# Altium footprint library EwgMicrochips.PcbLib: 61 footprints (part 1 of 4)
Each footprint in its own frame and in the unit in brackets; x right, y up, seen from the top. Pads: shape width x height; smd on the part's side, far side on the other; paste and mask are expansions set on the pad; w line width, h text height; cw(c..) or ccw(c..) is an arc to the next point about the centre after c.
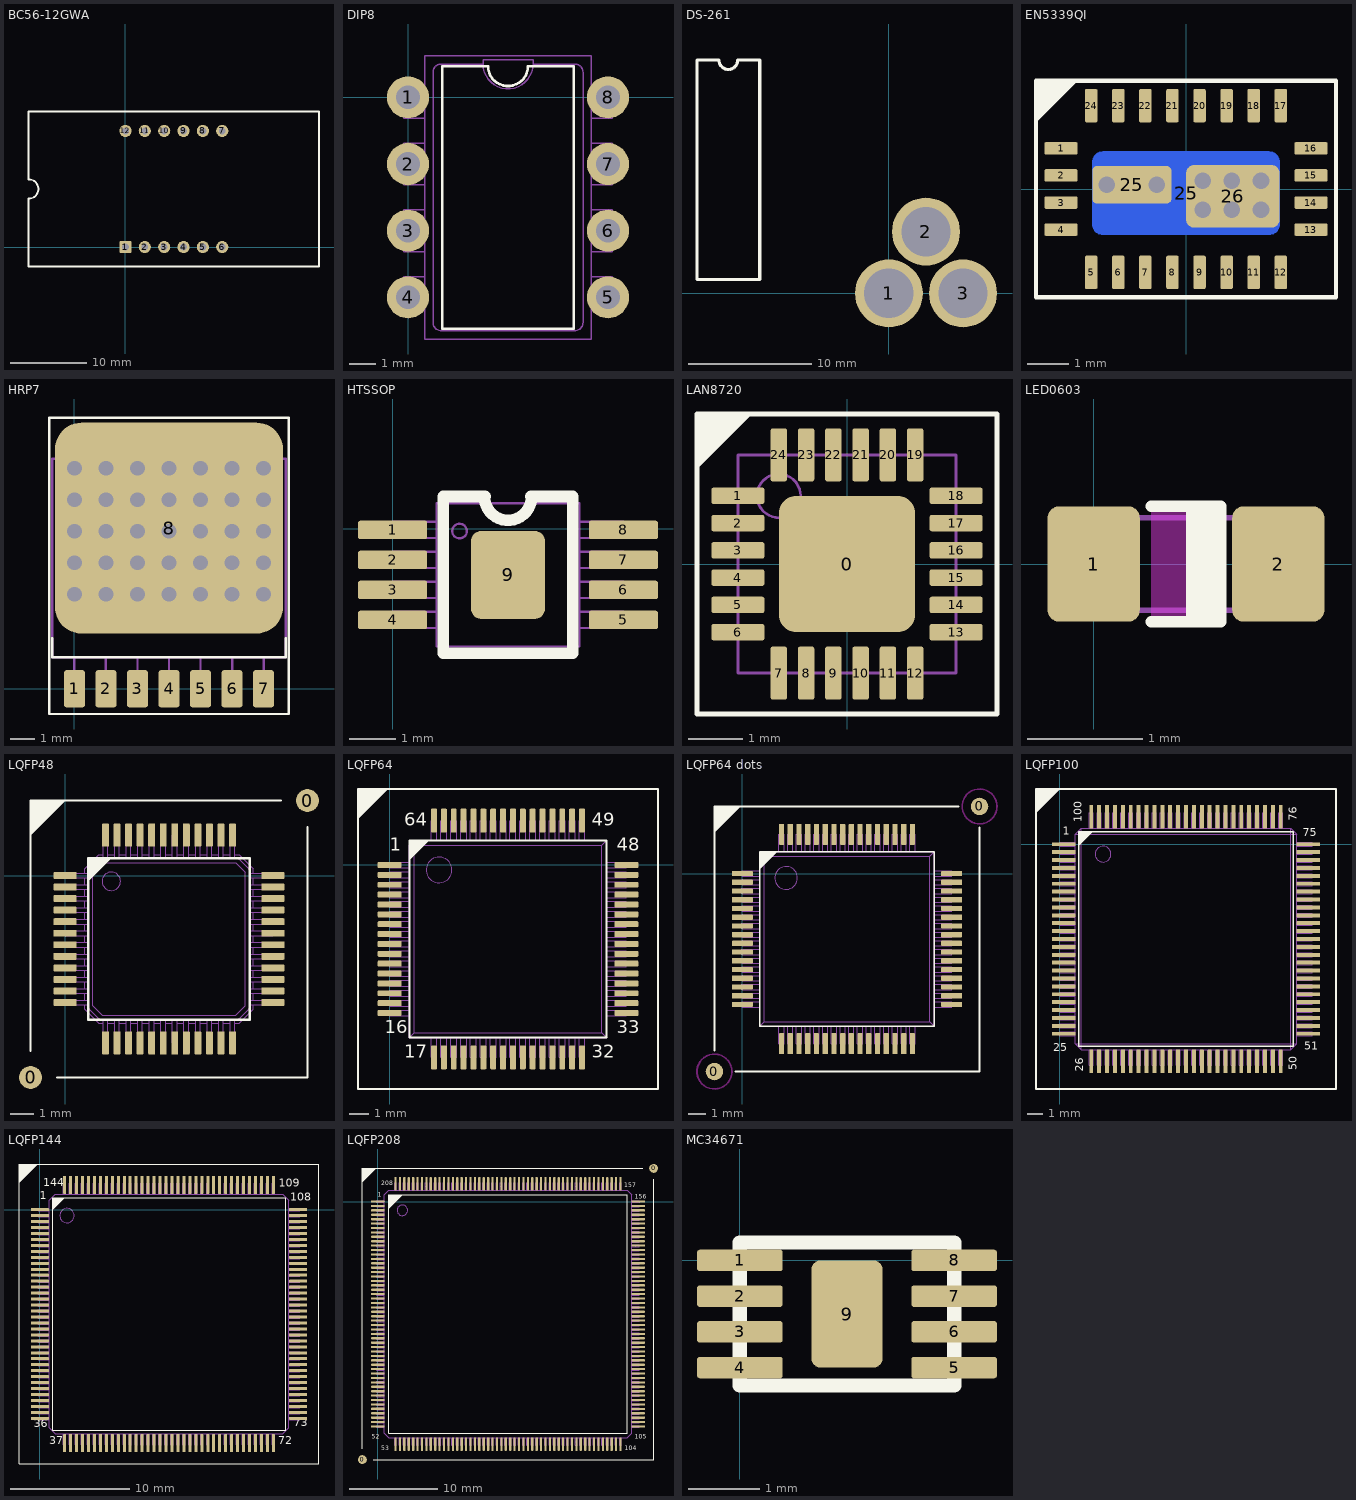
[diagram p0: the footprints below, top view; thin cyan lines are the x and y axes]

## BC56-12GWA [mm]
pads (12):
  rrect25% 1.6x1.6 hole 0.9: 1(0,0)
  round 1.6 hole 0.9: 2(2.54,0) 3(5.08,0) 4(7.62,0) 5(10.16,0) 6(12.7,0) 7(12.7,15.24) 8(10.16,15.24) 9(7.62,15.24) 10(5.08,15.24) 11(2.54,15.24) 12(0,15.24)
Top Overlay:
  lines w0.254: -12.7,-2.54 -12.7,6.35 ccw(c-12.7,7.62) -12.7,8.89 -12.7,17.78 25.4,17.78 25.4,-2.54 -12.7,-2.54

## DIP8 [mm]
pads (8):
  round 1.6 hole 0.9: 1(0,0) 2(0,-2.54) 3(0,-5.08) 4(0,-7.62) 5(7.62,-7.62) 6(7.62,-5.08) 7(7.62,-2.54) 8(7.62,0)
Top Overlay:
  lines w0.1: 1.31,-8.81 1.31,1.19 3.048,1.19 ccw(c3.81,1.19) 4.572,1.19 6.31,1.19 6.31,-8.81 1.31,-8.81
Mechanical 1:
  lines w0.05: 0.635,-7.938 -0.159,-7.938 -0.159,-7.461 -0.159,-6.826 0.635,-6.826 ; 0.635,-5.874 -0.159,-5.874 -0.159,-4.286 0.635,-4.286 ; 0.635,-3.334 -0.159,-3.334 -0.159,-1.746 0.635,-1.746 ; 0.635,-0.794 -0.159,-0.794 -0.159,-0.318 -0.159,0.318 0.635,0.318 ; 6.985,-7.938 7.779,-7.938 7.779,-7.461 7.779,-6.826 6.985,-6.826 ; 6.985,-5.874 7.779,-5.874 7.779,-4.286 6.985,-4.286 ; 6.985,-3.334 7.779,-3.334 7.779,-1.746 6.985,-1.746 ; 6.985,-0.794 7.779,-0.794 7.779,-0.318 7.779,0.318 6.985,0.318 ; 2.857,1.27 ccw(c3.81,1.27) 4.763,1.27 ; 2.857,1.27 1.27,1.27 ccw(c1.27,0.953) 0.953,0.953 0.953,-8.572 ccw(c1.27,-8.572) 1.27,-8.89 6.35,-8.89 ccw(c6.35,-8.572) 6.667,-8.572 6.667,0.953 ccw(c6.35,0.953) 6.35,1.27 4.763,1.27 ; 2.857,1.27 2.857,1.429 4.763,1.429 4.763,1.27 ; 0.635,-9.207 0.635,1.587 6.985,1.587 6.985,-9.207 0.635,-9.207
3D body: height 5.1, standoff -3.18, extent -0.28,-8.925 7.98,1.075

## DS-261 [mm]
pads (3):
  round 5.5 hole 4: 1(0,0) 2(3,5) 3(6,0)
Top Overlay:
  lines w0.254: -15.54,1.11 -15.54,18.89 -13.762,18.89 ccw(c-13,18.89) -12.238,18.89 -10.46,18.89 -10.46,1.11 -15.54,1.11

## EN5339QI [mm]
pads (27):
  rrect25% 0.8x0.3 smd: 1(-3,0.975) 2(-3,0.325) 3(-3,-0.325) 4(-3,-0.975) 13(3,-0.975) 14(3,-0.325) 15(3,0.325) 16(3,0.975)
  rrect25% 0.3x0.8 smd: 5(-2.275,-2) 6(-1.625,-2) 7(-0.975,-2) 8(-0.325,-2) 9(0.325,-2) 10(0.975,-2) 11(1.625,-2) 12(2.275,-2) 17(2.275,2) 18(1.625,2) 19(0.975,2) 20(0.325,2) 21(-0.325,2) 22(-0.975,2) 23(-1.625,2) 24(-2.275,2)
  rrect25% 1.9x0.9 smd: 25(-1.3,0.1)
  rrect25% 4.5x2 smd far side: 25(0,-0.1)
  rrect25% 2.25x1.5 smd: 26(1.125,-0.175)
via 0.4,0.2 diameter 0.6 hole 0.4
via 1.8,0.2 diameter 0.6 hole 0.4
via 0.4,-0.5 diameter 0.6 hole 0.4
via 1.8,-0.5 diameter 0.6 hole 0.4
via 1.1,-0.5 diameter 0.6 hole 0.4
via 1.1,0.2 diameter 0.6 hole 0.4
via -0.7,0.1 diameter 0.6 hole 0.4
via -1.9,0.1 diameter 0.6 hole 0.4
Top Overlay:
  region: -3.6,1.6 -2.6,2.6 -3.6,2.6
  lines w0.1: -3.6,-2.6 3.6,-2.6 3.6,2.6 -3.6,2.6 -3.6,-2.6
3D body: height 1.6, standoff 0, extent -3,-2 3,2

## HRP7 [mm]
pads (8):
  rrect25% 0.85x1.5 smd: 1(0,0) 2(1.27,0) 3(2.54,0) 4(3.81,0) 5(5.08,0) 6(6.35,0) 7(7.62,0)
  rrect25% 9.2x8.5 all layers, no hole: 8(3.81,6.477)
via 7.62,8.89 diameter 0.8 hole 0.6
via 7.62,7.62 diameter 0.8 hole 0.6
via 7.62,6.35 diameter 0.8 hole 0.6
via 7.62,5.08 diameter 0.8 hole 0.6
via 7.62,3.81 diameter 0.8 hole 0.6
via 6.35,3.81 diameter 0.8 hole 0.6
via 6.35,5.08 diameter 0.8 hole 0.6
via 6.35,6.35 diameter 0.8 hole 0.6
via 6.35,7.62 diameter 0.8 hole 0.6
via 6.35,8.89 diameter 0.8 hole 0.6
via 5.08,8.89 diameter 0.8 hole 0.6
via 5.08,7.62 diameter 0.8 hole 0.6
via 5.08,6.35 diameter 0.8 hole 0.6
via 5.08,5.08 diameter 0.8 hole 0.6
via 5.08,3.81 diameter 0.8 hole 0.6
via 3.81,3.81 diameter 0.8 hole 0.6
via 3.81,5.08 diameter 0.8 hole 0.6
via 3.81,6.35 diameter 0.8 hole 0.6
via 3.81,7.62 diameter 0.8 hole 0.6
via 3.81,8.89 diameter 0.8 hole 0.6
via 2.54,8.89 diameter 0.8 hole 0.6
via 2.54,3.81 diameter 0.8 hole 0.6
via 2.54,5.08 diameter 0.8 hole 0.6
via 2.54,6.35 diameter 0.8 hole 0.6
via 2.54,7.62 diameter 0.8 hole 0.6
via 1.27,7.62 diameter 0.8 hole 0.6
via 1.27,8.89 diameter 0.8 hole 0.6
via 1.27,6.35 diameter 0.8 hole 0.6
via 1.27,5.08 diameter 0.8 hole 0.6
via 1.27,3.81 diameter 0.8 hole 0.6
via 0,3.81 diameter 0.8 hole 0.6
via 0,5.08 diameter 0.8 hole 0.6
via 0,6.35 diameter 0.8 hole 0.6
via 0,7.62 diameter 0.8 hole 0.6
via 0,8.89 diameter 0.8 hole 0.6
Top Overlay:
  lines w0.1: -0.889,2.032 -0.889,1.27 8.509,1.27 8.509,2.032 ; -1.016,-1.016 -1.016,10.922 8.636,10.922 8.636,-1.016 -1.016,-1.016
Mechanical 1:
  lines w0.1: -0.635,9.271 -0.635,9.525 0.127,10.287 3.81,10.287 7.493,10.287 8.255,9.525 8.255,9.271 ; 0,-0.254 0,1.27 ; 1.27,-0.254 1.27,1.27 ; 2.54,-0.254 2.54,1.27 ; 3.81,-0.254 3.81,1.27 ; 5.08,-0.254 5.08,1.27 ; 6.35,-0.254 6.35,1.27 ; 7.62,-0.254 7.62,1.27 ; 3.81,1.27 -0.889,1.27 -0.889,9.271 8.509,9.271 8.509,1.27 3.81,1.27
3D body: height 1.91, standoff -0.01, extent -0.887,-0.253 8.508,10.287

## HTSSOP [mm]
pads (9):
  rrect25% 1.5x0.4 smd: 1(0,-0.025) 2(0,-0.675) 3(0,-1.325) 4(0,-1.975) 5(5,-1.975) 6(5,-1.325) 7(5,-0.675) 8(5,-0.025)
  rrect25% 1.6x1.9 smd: 9(2.5,-1)
Top Overlay:
  lines w0.254: 1.992,0.69 ccw(c2.5,0.69) 3.008,0.69 ; 2,0.7 1.1,0.7 1.1,-2.7 3.9,-2.7 3.9,0.7 3,0.7
Mechanical 1:
  circle w0.05: c1.45,-0.05 r0.158
  lines w0.05: 0.95,-2.15 0,-2.15 0,-1.8 0.95,-1.8 ; 0.95,-1.5 0,-1.5 0,-1.15 0.95,-1.15 ; 0.95,-0.85 0,-0.85 0,-0.5 0.95,-0.5 ; 0.95,-0.2 0,-0.2 0,0.15 0.95,0.15 ; 4.05,-2.15 5,-2.15 5,-1.8 4.05,-1.8 ; 4.05,-1.5 5,-1.5 5,-1.15 4.05,-1.15 ; 4.05,-0.85 5,-0.85 5,-0.5 4.05,-0.5 ; 4.05,-0.2 5,-0.2 5,0.15 4.05,0.15 ; 0.95,-2.55 4.05,-2.55 4.05,0.55 0.95,0.55 0.95,-2.55

## LAN8720 [mm]
pads (25):
  rrect25% 2.5x2.5 smd: 0(0,0)
  rrect25% 0.97x0.3 smd: 1(-2,1.25) 2(-2,0.75) 3(-2,0.25) 4(-2,-0.25) 5(-2,-0.75) 6(-2,-1.25) 13(2,-1.25) 14(2,-0.75) 15(2,-0.25) 16(2,0.25) 17(2,0.75) 18(2,1.25)
  rrect25% 0.3x0.97 smd: 7(-1.25,-2) 8(-0.75,-2) 9(-0.25,-2) 10(0.25,-2) 11(0.75,-2) 12(1.25,-2) 19(1.25,2) 20(0.75,2) 21(0.25,2) 22(-0.25,2) 23(-0.75,2) 24(-1.25,2)
Top Overlay:
  region: -2.75,2.75 -1.75,2.75 -2.75,1.75
  lines w0.1: -2.75,-2.75 -2.75,2.75 2.75,2.75 2.75,-2.75 -2.75,-2.75
Mechanical 1:
  circle w0.05: c-1.25,1.25 r0.4
  lines w0.05: -2,-2 -2,2 2,2 2,-2 -2,-2
3D body: height 1, standoff 0, extent -2.01,-2.01 2.01,2.01

## LED0603 [mm]
pads (2):
  rrect25% 0.8x1 smd: 1(0,0) 2(1.6,0)
Top Layer keep-out:
  region: 0.5,0.5 0.5,-0.5 1.1,-0.5 1.1,0.5
Top Overlay:
  region: 0.8,0.5 0.8,-0.5 1.1,-0.5 1.1,0.5
  lines w0.1: 0.5,-0.5 1.1,-0.5 1.1,0.5 0.5,0.5
Mechanical 1:
  lines w0.05: 0.3,-0.4 0.3,0.4 ; 1.3,-0.4 1.3,0.4 ; 0,-0.4 1.6,-0.4 1.6,0.4 0,0.4 0,-0.4

## LQFP48 [mm]
pads (50):
  round 1 smd paste+0.5: 0(-1.5,-8.75) 0(10.5,3.25)
  rrect25% 1x0.3 smd: 1(0,0) 2(0,-0.5) 3(0,-1) 4(0,-1.5) 5(0,-2) 6(0,-2.5) 7(0,-3) 8(0,-3.5) 9(0,-4) 10(0,-4.5) 11(0,-5) 12(0,-5.5) 25(9,-5.5) 26(9,-5) 27(9,-4.5) 28(9,-4) 29(9,-3.5) 30(9,-3) 31(9,-2.5) 32(9,-2) 33(9,-1.5) 34(9,-1) 35(9,-0.5) 36(9,0)
  rrect25% 0.3x1 smd: 13(1.75,-7.25) 14(2.25,-7.25) 15(2.75,-7.25) 16(3.25,-7.25) 17(3.75,-7.25) 18(4.25,-7.25) 19(4.75,-7.25) 20(5.25,-7.25) 21(5.75,-7.25) 22(6.25,-7.25) 23(6.75,-7.25) 24(7.25,-7.25) 37(7.25,1.75) 38(6.75,1.75) 39(6.25,1.75) 40(5.75,1.75) 41(5.25,1.75) 42(4.75,1.75) 43(4.25,1.75) 44(3.75,1.75) 45(3.25,1.75) 46(2.75,1.75) 47(2.25,1.75) 48(1.75,1.75)
Top Overlay:
  region: -1.5,1.75 -1.5,3.25 0,3.25
  region: 1,0.75 2,0.75 1,-0.25
  lines w0.1: -1.5,-7.6 -1.5,3.25 9.35,3.25 ; -0.35,-8.75 10.5,-8.75 10.5,2.1 ; 1,0.5 1.25,0.75 ; 1,-6.25 1,0.75 8,0.75 8,-6.25 1,-6.25
Mechanical 1:
  drawing of 265 lines, arcs and shapes, not listed
3D body: height 1.5, standoff 0, extent 0,-7.25 9,1.75

## LQFP64 [mm]
pads (64):
  rrect25% 1.2x0.3 smd: 1(0,0) 2(0,-0.5) 3(0,-1) 4(0,-1.5) 5(0,-2) 6(0,-2.5) 7(0,-3) 8(0,-3.5) 9(0,-4) 10(0,-4.5) 11(0,-5) 12(0,-5.5) 13(0,-6) 14(0,-6.5) 15(0,-7) 16(0,-7.5) 33(12,-7.5) 34(12,-7) 35(12,-6.5) 36(12,-6) 37(12,-5.5) 38(12,-5) 39(12,-4.5) 40(12,-4) 41(12,-3.5) 42(12,-3) 43(12,-2.5) 44(12,-2) 45(12,-1.5) 46(12,-1) 47(12,-0.5) 48(12,0)
  rrect25% 0.3x1.2 smd: 17(2.25,-9.75) 18(2.75,-9.75) 19(3.25,-9.75) 20(3.75,-9.75) 21(4.25,-9.75) 22(4.75,-9.75) 23(5.25,-9.75) 24(5.75,-9.75) 25(6.25,-9.75) 26(6.75,-9.75) 27(7.25,-9.75) 28(7.75,-9.75) 29(8.25,-9.75) 30(8.75,-9.75) 31(9.25,-9.75) 32(9.75,-9.75) 49(9.75,2.25) 50(9.25,2.25) 51(8.75,2.25) 52(8.25,2.25) 53(7.75,2.25) 54(7.25,2.25) 55(6.75,2.25) 56(6.25,2.25) 57(5.75,2.25) 58(5.25,2.25) 59(4.75,2.25) 60(4.25,2.25) 61(3.75,2.25) 62(3.25,2.25) 63(2.75,2.25) 64(2.25,2.25)
Top Overlay:
  region: 1,1.25 2,1.25 1,0.25
  region: -1.6,2.35 -1.6,3.85 -0.1,3.85
  lines w0.1: 1,1 1.25,1.25 ; -1.6,-11.35 -1.6,3.85 13.6,3.85 13.6,-11.35 -1.6,-11.35 ; 1,-8.75 11,-8.75 11,1.25 1,1.25 1,-8.75
  text "64" at 0.75,1.75 h1.15
  text "49" at 10.25,1.75 h1.15
  text "48" at 11.5,0.5 h1.15
  text "33" at 11.5,-8.75 h1.15
  text "32" at 10.25,-10 h1.15
  text "17" at 0.75,-10 h1.15
  text "16" at -0.25,-8.75 h1.15
  text "1" at 0,0.5 h1.15
Mechanical 1:
  drawing of 208 lines, arcs and shapes, not listed
3D body: height 1.69, standoff -0.02, extent 0,-9.75 12,2.25

## LQFP64 dots [mm]
pads (66):
  round 1 smd paste+0.5: 0(-1.6,-11.35) 0(13.6,3.85)
  rrect25% 1.2x0.3 smd: 1(0,0) 2(0,-0.5) 3(0,-1) 4(0,-1.5) 5(0,-2) 6(0,-2.5) 7(0,-3) 8(0,-3.5) 9(0,-4) 10(0,-4.5) 11(0,-5) 12(0,-5.5) 13(0,-6) 14(0,-6.5) 15(0,-7) 16(0,-7.5) 33(12,-7.5) 34(12,-7) 35(12,-6.5) 36(12,-6) 37(12,-5.5) 38(12,-5) 39(12,-4.5) 40(12,-4) 41(12,-3.5) 42(12,-3) 43(12,-2.5) 44(12,-2) 45(12,-1.5) 46(12,-1) 47(12,-0.5) 48(12,0)
  rrect25% 0.3x1.2 smd: 17(2.25,-9.75) 18(2.75,-9.75) 19(3.25,-9.75) 20(3.75,-9.75) 21(4.25,-9.75) 22(4.75,-9.75) 23(5.25,-9.75) 24(5.75,-9.75) 25(6.25,-9.75) 26(6.75,-9.75) 27(7.25,-9.75) 28(7.75,-9.75) 29(8.25,-9.75) 30(8.75,-9.75) 31(9.25,-9.75) 32(9.75,-9.75) 49(9.75,2.25) 50(9.25,2.25) 51(8.75,2.25) 52(8.25,2.25) 53(7.75,2.25) 54(7.25,2.25) 55(6.75,2.25) 56(6.25,2.25) 57(5.75,2.25) 58(5.25,2.25) 59(4.75,2.25) 60(4.25,2.25) 61(3.75,2.25) 62(3.25,2.25) 63(2.75,2.25) 64(2.25,2.25)
Top Layer keep-out:
  circle w0.1: c-1.6,-11.35 r1
  circle w0.1: c13.6,3.85 r1
Top Overlay:
  region: -1.6,2.35 -1.6,3.85 -0.1,3.85
  region: 1,1.25 2,1.25 1,0.25
  lines w0.1: -1.6,-10.15 -1.6,3.85 12.4,3.85 ; -0.4,-11.35 13.6,-11.35 13.6,2.65 ; 1,1 1.25,1.25 ; 1,-8.75 1,1.25 11,1.25 11,-8.75 1,-8.75
Top Solder:
  circle w0.254: c-1.6,-11.35 r0.707
  circle w0.254: c-1.6,-11.35 r0.906
  circle w0.254: c13.6,3.85 r0.707
  circle w0.254: c13.6,3.85 r0.906
Mechanical 1:
  drawing of 208 lines, arcs and shapes, not listed
3D body: height 1.69, standoff -0.02, extent 0,-9.75 12,2.25

## LQFP100 [mm]
pads (100):
  rrect25% 1.5x0.25 smd: 1(0.25,0) 2(0.25,-0.5) 3(0.25,-1) 4(0.25,-1.5) 5(0.25,-2) 6(0.25,-2.5) 7(0.25,-3) 8(0.25,-3.5) 9(0.25,-4) 10(0.25,-4.5) 11(0.25,-5) 12(0.25,-5.5) 13(0.25,-6) 14(0.25,-6.5) 15(0.25,-7) 16(0.25,-7.5) 17(0.25,-8) 18(0.25,-8.5) 19(0.25,-9) 20(0.25,-9.5) 21(0.25,-10) 22(0.25,-10.5) 23(0.25,-11) 24(0.25,-11.5) 25(0.25,-12) 51(15.75,-12) 52(15.75,-11.5) 53(15.75,-11) 54(15.75,-10.5) 55(15.75,-10) 56(15.75,-9.5) 57(15.75,-9) 58(15.75,-8.5) 59(15.75,-8) 60(15.75,-7.5) 61(15.75,-7) 62(15.75,-6.5) 63(15.75,-6) 64(15.75,-5.5) 65(15.75,-5) 66(15.75,-4.5) 67(15.75,-4) 68(15.75,-3.5) 69(15.75,-3) 70(15.75,-2.5) 71(15.75,-2) 72(15.75,-1.5) 73(15.75,-1) 74(15.75,-0.5) 75(15.75,0)
  rrect25% 0.25x1.5 smd: 26(2,-13.75) 27(2.5,-13.75) 28(3,-13.75) 29(3.5,-13.75) 30(4,-13.75) 31(4.5,-13.75) 32(5,-13.75) 33(5.5,-13.75) 34(6,-13.75) 35(6.5,-13.75) 36(7,-13.75) 37(7.5,-13.75) 38(8,-13.75) 39(8.5,-13.75) 40(9,-13.75) 41(9.5,-13.75) 42(10,-13.75) 43(10.5,-13.75) 44(11,-13.75) 45(11.5,-13.75) 46(12,-13.75) 47(12.5,-13.75) 48(13,-13.75) 49(13.5,-13.75) 50(14,-13.75) 76(14,1.75) 77(13.5,1.75) 78(13,1.75) 79(12.5,1.75) 80(12,1.75) 81(11.5,1.75) 82(11,1.75) 83(10.5,1.75) 84(10,1.75) 85(9.5,1.75) 86(9,1.75) 87(8.5,1.75) 88(8,1.75) 89(7.5,1.75) 90(7,1.75) 91(6.5,1.75) 92(6,1.75) 93(5.5,1.75) 94(5,1.75) 95(4.5,1.75) 96(4,1.75) 97(3.5,1.75) 98(3,1.75) 99(2.5,1.75) 100(2,1.75)
Top Overlay:
  region: 1.2,-0.1 2.1,0.8 1.2,0.8
  region: -1.5,2 -1.5,3.5 0,3.5
  lines w0.1: -1.5,-15.5 -1.5,3.5 17.5,3.5 17.5,-15.5 -1.5,-15.5 ; 1.2,-12.8 14.8,-12.8 14.8,0.8 1.2,0.8 1.2,-12.8
  text "100" at 1.4,1.4 h0.5
  text "1" at 0.2,0.6 h0.5
  text "25" at -0.4,-13.1 h0.5
  text "26" at 1.5,-14.4 h0.5
  text "50" at 15,-14.3 h0.5
  text "51" at 15.5,-13 h0.5
  text "75" at 15.4,0.5 h0.5
  text "76" at 15,1.5 h0.5
Mechanical 1:
  drawing of 321 lines, arcs and shapes, not listed
3D body: height 1.6, standoff 0, extent 0,-14 16,2

## LQFP144 [mm]
pads (144):
  rrect25% 1.5x0.25 smd mask+0.05: 1(0,0) 2(0,-0.5) 3(0,-1) 4(0,-1.5) 5(0,-2) 6(0,-2.5) 7(0,-3) 8(0,-3.5) 9(0,-4) 10(0,-4.5) 11(0,-5) 12(0,-5.5) 13(0,-6) 14(0,-6.5) 15(0,-7) 16(0,-7.5) 17(0,-8) 18(0,-8.5) 19(0,-9) 20(0,-9.5) 21(0,-10) 22(0,-10.5) 23(0,-11) 24(0,-11.5) 25(0,-12) 26(0,-12.5) 27(0,-13) 28(0,-13.5) 29(0,-14) 30(0,-14.5) 31(0,-15) 32(0,-15.5) 33(0,-16) 34(0,-16.5) 35(0,-17) 36(0,-17.5) 73(21.65,-17.5) 74(21.65,-17) 75(21.65,-16.5) 76(21.65,-16) 77(21.65,-15.5) 78(21.65,-15) 79(21.65,-14.5) 80(21.65,-14) 81(21.65,-13.5) 82(21.65,-13) 83(21.65,-12.5) 84(21.65,-12) 85(21.65,-11.5) 86(21.65,-11) 87(21.65,-10.5) 88(21.65,-10) 89(21.65,-9.5) 90(21.65,-9) 91(21.65,-8.5) 92(21.65,-8) 93(21.65,-7.5) 94(21.65,-7) 95(21.65,-6.5) 96(21.65,-6) 97(21.65,-5.5) 98(21.65,-5) 99(21.65,-4.5) 100(21.65,-4) 101(21.65,-3.5) 102(21.65,-3) 103(21.65,-2.5) 104(21.65,-2) 105(21.65,-1.5) 106(21.65,-1) 107(21.65,-0.5) 108(21.65,0)
  rrect25% 0.25x1.5 smd mask+0.05: 37(2.075,-19.575) 38(2.575,-19.575) 39(3.075,-19.575) 40(3.575,-19.575) 41(4.075,-19.575) 42(4.575,-19.575) 43(5.075,-19.575) 44(5.575,-19.575) 45(6.075,-19.575) 46(6.575,-19.575) 47(7.075,-19.575) 48(7.575,-19.575) 49(8.075,-19.575) 50(8.575,-19.575) 51(9.075,-19.575) 52(9.575,-19.575) 53(10.075,-19.575) 54(10.575,-19.575) 55(11.075,-19.575) 56(11.575,-19.575) 57(12.075,-19.575) 58(12.575,-19.575) 59(13.075,-19.575) 60(13.575,-19.575) 61(14.075,-19.575) 62(14.575,-19.575) 63(15.075,-19.575) 64(15.575,-19.575) 65(16.075,-19.575) 66(16.575,-19.575) 67(17.075,-19.575) 68(17.575,-19.575) 69(18.075,-19.575) 70(18.575,-19.575) 71(19.075,-19.575) 72(19.575,-19.575) 109(19.575,2.075) 110(19.075,2.075) 111(18.575,2.075) 112(18.075,2.075) 113(17.575,2.075) 114(17.075,2.075) 115(16.575,2.075) 116(16.075,2.075) 117(15.575,2.075) 118(15.075,2.075) 119(14.575,2.075) 120(14.075,2.075) 121(13.575,2.075) 122(13.075,2.075) 123(12.575,2.075) 124(12.075,2.075) 125(11.575,2.075) 126(11.075,2.075) 127(10.575,2.075) 128(10.075,2.075) 129(9.575,2.075) 130(9.075,2.075) 131(8.575,2.075) 132(8.075,2.075) 133(7.575,2.075) 134(7.075,2.075) 135(6.575,2.075) 136(6.075,2.075) 137(5.575,2.075) 138(5.075,2.075) 139(4.575,2.075) 140(4.075,2.075) 141(3.575,2.075) 142(3.075,2.075) 143(2.575,2.075) 144(2.075,2.075)
Top Overlay:
  region: 1.1,1 1.1,0 2.1,1
  region: -1.75,3.825 -0.175,3.825 -1.75,2.25
  lines w0.1: -1.75,-21.325 -1.75,3.825 23.4,3.825 23.4,-21.325 -1.75,-21.325 ; 1.1,-18.5 1.1,1 20.6,1 20.6,-18.5 1.1,-18.5
  text "36" at -0.5,-18.5 h1.15
  text "37" at 0.8,-19.9 h1.15
  text "144" at 0.3,1.7 h1.15
  text "1" at 0,0.6 h1.15
  text "72" at 20,-19.9 h1.15
  text "73" at 21.3,-18.4 h1.15
  text "108" at 21,0.5 h1.15
  text "109" at 20.035,1.68 h1.15
Mechanical 1:
  drawing of 585 lines, arcs and shapes, not listed
3D body: height 1.68, standoff -0.02, extent -0.175,-19.75 21.828,2.253

## LQFP208 [mm]
pads (210):
  round 1 smd paste+0 mask+0.5: 0(-1.75,-29.25) 0(31.25,3.75)
  rrect25% 1.5x0.25 smd mask+0.05: 1(0,0) 2(0,-0.5) 3(0,-1) 4(0,-1.5) 5(0,-2) 6(0,-2.5) 7(0,-3) 8(0,-3.5) 9(0,-4) 10(0,-4.5) 11(0,-5) 12(0,-5.5) 13(0,-6) 14(0,-6.5) 15(0,-7) 16(0,-7.5) 17(0,-8) 18(0,-8.5) 19(0,-9) 20(0,-9.5) 21(0,-10) 22(0,-10.5) 23(0,-11) 24(0,-11.5) 25(0,-12) 26(0,-12.5) 27(0,-13) 28(0,-13.5) 29(0,-14) 30(0,-14.5) 31(0,-15) 32(0,-15.5) 33(0,-16) 34(0,-16.5) 35(0,-17) 36(0,-17.5) 37(0,-18) 38(0,-18.5) 39(0,-19) 40(0,-19.5) 41(0,-20) 42(0,-20.5) 43(0,-21) 44(0,-21.5) 45(0,-22) 46(0,-22.5) 47(0,-23) 48(0,-23.5) 49(0,-24) 50(0,-24.5) 51(0,-25) 52(0,-25.5) 105(29.5,-25.5) 106(29.5,-25) 107(29.5,-24.5) 108(29.5,-24) 109(29.5,-23.5) 110(29.5,-23) 111(29.5,-22.5) 112(29.5,-22) 113(29.5,-21.5) 114(29.5,-21) 115(29.5,-20.5) 116(29.5,-20) 117(29.5,-19.5) 118(29.5,-19) 119(29.5,-18.5) 120(29.5,-18) 121(29.5,-17.5) 122(29.5,-17) 123(29.5,-16.5) 124(29.5,-16) 125(29.5,-15.5) 126(29.5,-15) 127(29.5,-14.5) 128(29.5,-14) 129(29.5,-13.5) 130(29.5,-13) 131(29.5,-12.5) 132(29.5,-12) 133(29.5,-11.5) 134(29.5,-11) 135(29.5,-10.5) 136(29.5,-10) 137(29.5,-9.5) 138(29.5,-9) 139(29.5,-8.5) 140(29.5,-8) 141(29.5,-7.5) 142(29.5,-7) 143(29.5,-6.5) 144(29.5,-6) 145(29.5,-5.5) 146(29.5,-5) 147(29.5,-4.5) 148(29.5,-4) 149(29.5,-3.5) 150(29.5,-3) 151(29.5,-2.5) 152(29.5,-2) 153(29.5,-1.5) 154(29.5,-1) 155(29.5,-0.5) 156(29.5,0)
  rrect25% 0.25x1.5 smd mask+0.05: 53(2,-27.5) 54(2.5,-27.5) 55(3,-27.5) 56(3.5,-27.5) 57(4,-27.5) 58(4.5,-27.5) 59(5,-27.5) 60(5.5,-27.5) 61(6,-27.5) 62(6.5,-27.5) 63(7,-27.5) 64(7.5,-27.5) 65(8,-27.5) 66(8.5,-27.5) 67(9,-27.5) 68(9.5,-27.5) 69(10,-27.5) 70(10.5,-27.5) 71(11,-27.5) 72(11.5,-27.5) 73(12,-27.5) 74(12.5,-27.5) 75(13,-27.5) 76(13.5,-27.5) 77(14,-27.5) 78(14.5,-27.5) 79(15,-27.5) 80(15.5,-27.5) 81(16,-27.5) 82(16.5,-27.5) 83(17,-27.5) 84(17.5,-27.5) 85(18,-27.5) 86(18.5,-27.5) 87(19,-27.5) 88(19.5,-27.5) 89(20,-27.5) 90(20.5,-27.5) 91(21,-27.5) 92(21.5,-27.5) 93(22,-27.5) 94(22.5,-27.5) 95(23,-27.5) 96(23.5,-27.5) 97(24,-27.5) 98(24.5,-27.5) 99(25,-27.5) 100(25.5,-27.5) 101(26,-27.5) 102(26.5,-27.5) 103(27,-27.5) 104(27.5,-27.5) 157(27.5,2) 158(27,2) 159(26.5,2) 160(26,2) 161(25.5,2) 162(25,2) 163(24.5,2) 164(24,2) 165(23.5,2) 166(23,2) 167(22.5,2) 168(22,2) 169(21.5,2) 170(21,2) 171(20.5,2) 172(20,2) 173(19.5,2) 174(19,2) 175(18.5,2) 176(18,2) 177(17.5,2) 178(17,2) 179(16.5,2) 180(16,2) 181(15.5,2) 182(15,2) 183(14.5,2) 184(14,2) 185(13.5,2) 186(13,2) 187(12.5,2) 188(12,2) 189(11.5,2) 190(11,2) 191(10.5,2) 192(10,2) 193(9.5,2) 194(9,2) 195(8.5,2) 196(8,2) 197(7.5,2) 198(7,2) 199(6.5,2) 200(6,2) 201(5.5,2) 202(5,2) 203(4.5,2) 204(4,2) 205(3.5,2) 206(3,2) 207(2.5,2) 208(2,2)
Top Overlay:
  region: -1.75,3.75 -0.175,3.75 -1.75,2.175
  region: 1.25,0.75 2.825,0.75 1.25,-0.825
  lines w0.1: -1.75,-28 -1.75,3.75 30,3.75 ; -0.5,-29.25 31.25,-29.25 31.25,2.5 ; 1.25,-26.25 28.25,-26.25 28.25,0.75 1.25,0.75 1.25,-26.25
  text "52" at -0.69,-26.87 h0.5
  text "53" at 0.41,-28.17 h0.5
  text "104" at 28.01,-28.17 h0.5
  text "105" at 29.11,-26.87 h0.5
  text "156" at 29.11,0.33 h0.5
  text "157" at 27.91,1.63 h0.5
  text "208" at 0.375,1.85 h0.5
  text "1" at -0.025,0.55 h0.5
Mechanical 1:
  drawing of 843 lines, arcs and shapes, not listed
3D body: height 1.7, standoff -0.01, extent -0.25,-27.75 29.75,2.25

## MC34671 [mm]
pads (9):
  rrect25% 1.2x0.3 smd: 1(0,0) 2(0,-0.5) 3(0,-1) 4(0,-1.5) 5(3,-1.5) 6(3,-1) 7(3,-0.5) 8(3,0)
  rrect25% 1x1.5 smd: 9(1.5,-0.75)
Top Overlay:
  lines w0.2: 0,-1.75 3,-1.75 3,0.25 0,0.25 0,-1.75

## PCBComponent_1 [mm]